# Altium footprint library ICs And Semiconductors THD.PcbLib: 292 footprints (part 16 of 19)
Each footprint in its own frame and in the unit in brackets; x right, y up, seen from the top. Pads: shape width x height; smd on the part's side, far side on the other; paste and mask are expansions set on the pad; w line width, h text height; cw(c..) or ccw(c..) is an arc to the next point about the centre after c.
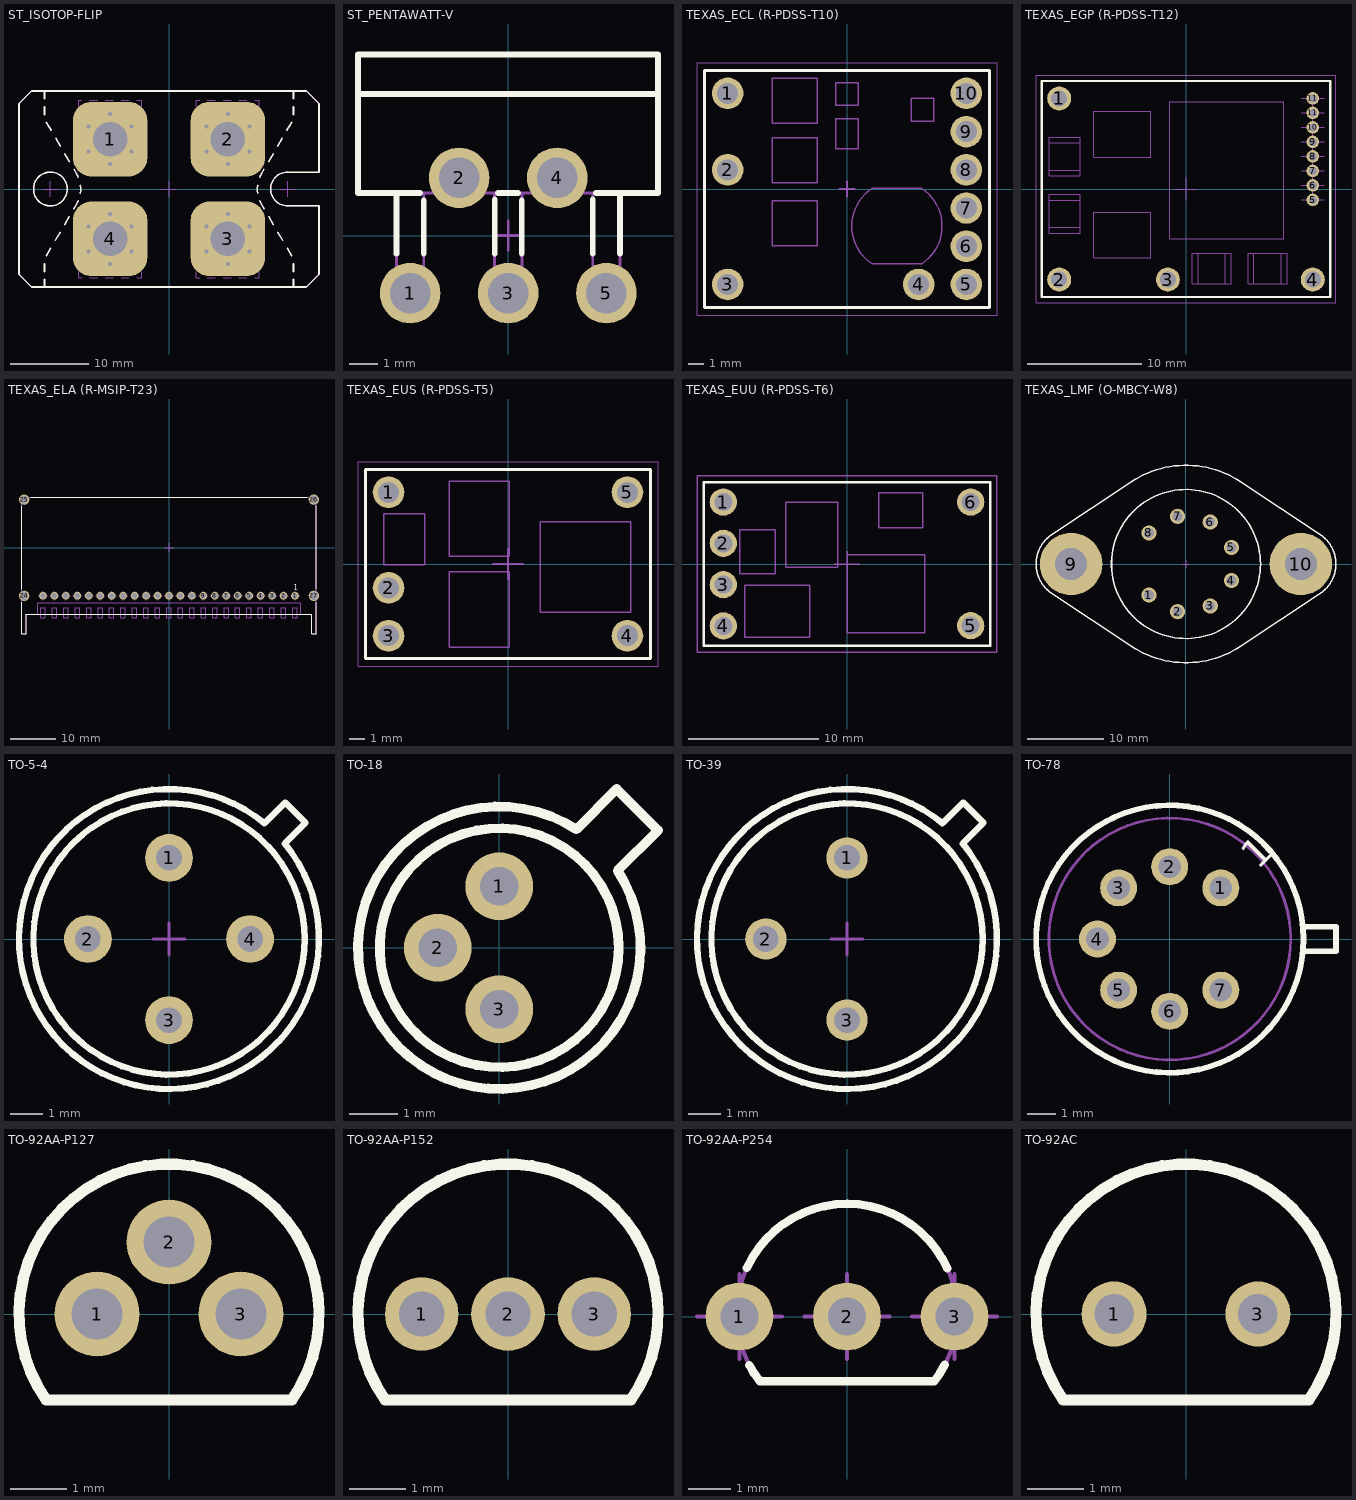
[diagram p15: the footprints below, top view; thin cyan lines are the x and y axes]

## ST_ISOTOP-FLIP [mm] "STMicroelectronics isotop Case, Body 38mm x 25.5mm, Screws on PCB Version"
height 12.2
pads (4):
  rrect50% 9.5x9.5 hole 4.4: 1(-7.5,6.35) 2(7.5,6.35) 3(7.5,-6.35) 4(-7.5,-6.35)
via -4.75,-4.763 diameter 1 hole 0.5
via -7.5,-3.175 diameter 1 hole 0.5
via -10.25,-4.763 diameter 1 hole 0.5
via -10.25,-7.938 diameter 1 hole 0.5
via -7.5,-9.525 diameter 1 hole 0.5
via -4.75,-7.938 diameter 1 hole 0.5
via 10.25,-4.763 diameter 1 hole 0.5
via 7.5,-3.175 diameter 1 hole 0.5
via 4.75,-4.763 diameter 1 hole 0.5
via 4.75,-7.938 diameter 1 hole 0.5
via 7.5,-9.525 diameter 1 hole 0.5
via 10.25,-7.938 diameter 1 hole 0.5
via -4.75,7.938 diameter 1 hole 0.5
via -7.5,9.525 diameter 1 hole 0.5
via -10.25,7.938 diameter 1 hole 0.5
via -10.25,4.763 diameter 1 hole 0.5
via -7.5,3.175 diameter 1 hole 0.5
via -4.75,4.763 diameter 1 hole 0.5
via 10.25,7.938 diameter 1 hole 0.5
via 7.5,9.525 diameter 1 hole 0.5
via 4.75,7.938 diameter 1 hole 0.5
via 4.75,4.763 diameter 1 hole 0.5
via 7.5,3.175 diameter 1 hole 0.5
via 10.25,4.763 diameter 1 hole 0.5
Top Overlay:
  circle w0.2: c-15.1,0 r2.15
  lines w0.2: -15.85,-11.521 -15.85,-12.479 ; -15.85,-10.521 -15.85,-9.521 ; -15.85,9.479 -15.85,10.479 ; -15.85,11.479 -15.85,12.479 ; -15.628,-8.521 -15.043,-7.521 ; -15.603,8.479 -15.018,7.479 ; -14.457,-6.521 -13.871,-5.521 ; -14.432,6.479 -13.847,5.479 ; -13.286,-4.521 -12.7,-3.521 ; -13.261,4.479 -12.676,3.479 ; -12.115,-2.521 -11.778,-1.945 ccw(c-15.1,0) -11.563,-1.521 ; -12.09,2.479 -11.778,1.945 cw(c-15.1,0) -11.545,1.479 ; -11.285,-0.521 ccw(c-15.1,0) -11.28,0.479 ; 11.28,0.479 ccw(c15.1,0) 11.285,-0.521 ; 11.545,1.479 cw(c15.1,0) 11.778,1.945 12.09,2.479 ; 11.563,-1.521 ccw(c15.1,0) 11.778,-1.945 12.115,-2.521 ; 12.676,3.479 13.261,4.479 ; 12.7,-3.521 13.286,-4.521 ; 13.847,5.479 14.432,6.479 ; 13.871,-5.521 14.457,-6.521 ; 15.018,7.479 15.603,8.479 ; 15.043,-7.521 15.628,-8.521 ; 15.85,-11.521 15.85,-12.479 ; 15.85,-10.521 15.85,-9.521 ; 15.85,9.479 15.85,10.479 ; 15.85,11.479 15.85,12.479 ; -15.85,-12.479 -17.5,-12.479 -19.1,-10.879 -19.1,10.879 -17.5,12.479 -15.85,12.479 ; -15.85,-12.479 15.85,-12.479 ; -15.85,12.479 15.85,12.479 ; 15.1,-2.15 cw(c15.1,0) 15.1,2.15 ; 15.1,-2.15 19.1,-2.15 ; 15.1,-2.15 19.1,-2.15 ; 15.1,2.15 19.1,2.15 ; 15.1,2.15 19.1,2.15 ; 15.85,-12.479 17.5,-12.479 19.1,-10.879 19.1,-2.15 ; 15.85,12.479 17.5,12.479 19.1,10.879 19.1,2.15
Notvisible:
  lines w0.1: -15.1,0 -16.1,0 -15.1,0 ; -15.1,0 -14.1,0 -15.1,0 ; -15.1,0 -15.1,1 -15.1,0 ; -15.1,0 -15.1,-1 -15.1,0 ; -7.5,-6.35 -8.5,-6.35 -7.5,-6.35 ; -7.5,-6.35 -6.5,-6.35 -7.5,-6.35 ; -7.5,-6.35 -7.5,-5.35 -7.5,-6.35 ; -7.5,-6.35 -7.5,-7.35 -7.5,-6.35 ; -7.5,6.35 -8.5,6.35 -7.5,6.35 ; -7.5,6.35 -6.5,6.35 -7.5,6.35 ; -7.5,6.35 -7.5,7.35 -7.5,6.35 ; -7.5,6.35 -7.5,5.35 -7.5,6.35 ; 0,0 -1,0 0,0 ; 0,0 1,0 0,0 ; 0,0 0,1 0,0 ; 0,0 0,-1 0,0 ; 7.5,-6.35 6.5,-6.35 7.5,-6.35 ; 7.5,-6.35 8.5,-6.35 7.5,-6.35 ; 7.5,-6.35 7.5,-5.35 7.5,-6.35 ; 7.5,-6.35 7.5,-7.35 7.5,-6.35 ; 7.5,6.35 6.5,6.35 7.5,6.35 ; 7.5,6.35 8.5,6.35 7.5,6.35 ; 7.5,6.35 7.5,7.35 7.5,6.35 ; 7.5,6.35 7.5,5.35 7.5,6.35 ; 15.1,0 14.1,0 15.1,0 ; 15.1,0 16.1,0 15.1,0 ; 15.1,0 15.1,1 15.1,0 ; 15.1,0 15.1,-1 15.1,0
Mechanical 14:
  circle w0.1: c-15.1,0 r2.15
  circle w0.1: c-7.5,-6.35 r2.2
  circle w0.1: c7.5,-6.35 r2.2
  circle w0.1: c7.5,6.35 r2.2
  circle w0.1: c-7.5,6.35 r2.2
  lines w0.1: -15.85,-11.521 -15.85,-12.479 ; -15.85,-10.521 -15.85,-9.521 ; -15.85,9.479 -15.85,10.479 ; -15.85,11.479 -15.85,12.479 ; -15.628,-8.521 -15.043,-7.521 ; -15.603,8.479 -15.018,7.479 ; -14.457,-6.521 -13.871,-5.521 ; -14.432,6.479 -13.847,5.479 ; -13.286,-4.521 -12.7,-3.521 ; -13.261,4.479 -12.676,3.479 ; -12.115,-2.521 -11.778,-1.945 ccw(c-15.1,0) -11.563,-1.521 ; -12.09,2.479 -11.778,1.945 cw(c-15.1,0) -11.545,1.479 ; -11.5,-10.521 -11.5,-11.314 -11.1,-11.314 ; -11.5,-9.521 -11.5,-8.521 ; -11.5,-7.521 -11.5,-6.521 ; -11.5,-5.521 -11.5,-4.521 ; -11.5,-3.521 -11.5,-3.342 ; -11.5,3.479 -11.5,3.342 -10.637,2.479 ; -11.5,4.479 -11.5,5.479 ; -11.5,6.479 -11.5,7.479 ; -11.5,8.479 -11.5,9.479 ; -11.5,10.479 -11.5,11.314 -11.1,11.314 ; -11.285,-0.521 ccw(c-15.1,0) -11.28,0.479 ; -10.1,-11.314 -9.1,-11.314 ; -10.1,11.314 -9.1,11.314 ; -10,1.842 -9.1,1.842 ; -8.1,-11.314 -7.1,-11.314 ; -8.1,1.842 -7.1,1.842 ; -8.1,11.314 -7.1,11.314 ; -6.1,-11.314 -5.1,-11.314 ; -6.1,1.842 -5.1,1.842 ; -6.1,11.314 -5.1,11.314 ; -5.1,-1.842 -6.1,-1.842 -5,-1.842 ; -4.363,2.479 -3.5,3.342 -3.5,3.479 ; -4.1,-11.314 -3.5,-11.314 -3.5,-10.521 ; -4.1,11.314 -3.5,11.314 -3.5,10.479 ; -3.5,-9.521 -3.5,-8.521 ; -3.5,-7.521 -3.5,-6.521 ; -3.5,-5.521 -3.5,-4.521 ; -3.5,-3.521 -3.5,-3.342 ; -3.5,4.479 -3.5,5.479 ; -3.5,6.479 -3.5,7.479 ; -3.5,8.479 -3.5,9.479 ; 3.5,-10.521 3.5,-11.314 3.9,-11.314 ; 3.5,-9.521 3.5,-8.521 ; 3.5,-7.521 3.5,-6.521 ; 3.5,-5.521 3.5,-4.521 ; 3.5,-3.521 3.5,-3.342 4.321,-2.521 ; 3.5,3.479 3.5,3.342 4.363,2.479 ; 3.5,4.479 3.5,5.479 ; 3.5,6.479 3.5,7.479 ; 3.5,8.479 3.5,9.479 ; 3.5,10.479 3.5,11.314 3.9,11.314 ; 4.9,-11.314 5.9,-11.314 ; 4.9,11.314 5.9,11.314 ; 5,-1.842 5.9,-1.842 ; 5,1.842 5.9,1.842 ; 6.9,-11.314 7.9,-11.314 ; 6.9,-1.842 7.9,-1.842 ; 6.9,1.842 7.9,1.842 ; 6.9,11.314 7.9,11.314 ; 8.9,-11.314 9.9,-11.314 ; 8.9,-1.842 9.9,-1.842 ; 8.9,1.842 9.9,1.842 ; 8.9,11.314 9.9,11.314 ; 10.637,2.479 11.5,3.342 11.5,3.479 ; 10.679,-2.521 11.5,-3.342 11.5,-3.521 ; 10.9,-11.314 11.5,-11.314 11.5,-10.521 ; 10.9,11.314 11.5,11.314 11.5,10.479 ; 11.28,0.479 ccw(c15.1,0) 11.285,-0.521 ; 11.5,-9.521 11.5,-8.521 ; 11.5,-7.521 11.5,-6.521 ; 11.5,-5.521 11.5,-4.521 ; 11.5,4.479 11.5,5.479 ; 11.5,6.479 11.5,7.479 ; 11.5,8.479 11.5,9.479 ; 11.545,1.479 cw(c15.1,0) 11.778,1.945 12.09,2.479 ; 11.563,-1.521 ccw(c15.1,0) 11.778,-1.945 12.115,-2.521 ; 12.676,3.479 13.261,4.479 ; 12.7,-3.521 13.286,-4.521 ; 13.847,5.479 14.432,6.479 ; 13.871,-5.521 14.457,-6.521 ; 15.018,7.479 15.603,8.479 ; 15.043,-7.521 15.628,-8.521 ; 15.85,-11.521 15.85,-12.479 ; 15.85,-10.521 15.85,-9.521 ; 15.85,9.479 15.85,10.479 ; 15.85,11.479 15.85,12.479 ; -15.85,-12.479 15.85,-12.479 ; -15.85,-12.479 -17.5,-12.479 -19.1,-10.879 -19.1,10.879 -17.5,12.479 -15.85,12.479 ; -15.85,12.479 15.85,12.479 ; -11.5,-3.342 -10.679,-2.521 -11.5,-3.342 ; -3.5,-3.342 -4.321,-2.521 -3.5,-3.342 ; 15.1,-2.15 cw(c15.1,0) 15.1,2.15 ; 15.1,-2.15 19.1,-2.15 ; 15.1,-2.15 19.1,-2.15 ; 15.1,2.15 19.1,2.15 ; 15.1,2.15 19.1,2.15 ; 15.85,-12.479 17.5,-12.479 19.1,-10.879 19.1,-2.15 ; 15.85,12.479 17.5,12.479 19.1,10.879 19.1,2.15 ; -10,-1.842 -9.1,-1.842 -10,-1.842 ; -8.1,-1.842 -7.1,-1.842 -8.1,-1.842
3D body "ST_ISOTOP-Flip_Part2.stp": height 10.24, standoff -4.69, extent -11.5,-10.365 11.5,10.365
3D body "ST_ISOTOP-Flip_Part1.stp": height 12.04, standoff 0, extent -19.1,-12.479 19.1,12.479

## ST_PENTAWATT-V [mm] "ONSEMICONDUCTOR 5 Leads PENTAWATT V Case"
height 3.68
pads (5):
  round 2.1 hole 1.4: 1(-3.4,-2) 2(-1.7,2) 3(0,-2) 4(1.7,2) 5(3.4,-2)
Top Overlay:
  lines w0.2: -5.208,4.905 5.192,4.905 ; -3.871,-0.631 -3.871,1.475 ; -3.06,1.475 -5.208,1.475 -5.208,6.275 5.192,6.275 5.192,1.475 3.043,1.475 ; -2.929,-0.626 -2.929,1.218 ; -0.471,-0.631 -0.471,1.244 ; -0.357,1.475 0.34,1.475 ; 0.471,-0.626 0.471,1.218 ; 2.929,-0.631 2.929,1.244 ; 3.871,-0.626 3.871,1.475
Notvisible:
  lines w0.1: -3.9,-2 -3.4,-2 ; -3.4,-2.5 -3.4,-2 ; -3.4,-1.5 -3.4,-2 ; -2.9,-2 -3.4,-2 ; -2.2,2 -1.7,2 ; -1.7,1.5 -1.7,2 ; -1.7,2.5 -1.7,2 ; -1.2,2 -1.7,2 ; -0.5,-2 0,-2 ; -0.5,0 0,0 ; 0,-2.5 0,-2 ; 0,-1.5 0,-2 ; 0,-0.5 0,0 ; 0,0.5 0,0 ; 0.5,-2 0,-2 ; 0.5,0 0,0 ; 1.2,2 1.7,2 ; 1.7,1.5 1.7,2 ; 1.7,2.5 1.7,2 ; 2.2,2 1.7,2 ; 2.9,-2 3.4,-2 ; 3.4,-2.5 3.4,-2 ; 3.4,-1.5 3.4,-2 ; 3.9,-2 3.4,-2
Mechanical 14:
  lines w0.1: -5.208,4.905 5.192,4.905 ; -3.871,1.475 -3.871,-2.225 -2.929,-2.225 -2.929,1.475 ; -0.471,1.475 -0.471,-2.225 0.471,-2.225 0.471,1.475 ; 2.929,1.475 2.929,-2.225 3.871,-2.225 3.871,1.475 ; -5.208,1.475 5.192,1.475 5.192,6.275 -5.208,6.275 -5.208,1.475
3D body "ST_PENTAWATT-V.stp": height 20.85, standoff -4.55, extent -5.208,-2.225 5.192,6.275

## TEXAS_ECL (R-PDSS-T10) [mm] "Texas ECL (R-PDSS-T10)  Case"
height 8.5
pads (10):
  round 2.1 hole 1.4: 1(-7.935,6.355) 2(-7.935,1.275) 3(-7.935,-6.345) 4(4.765,-6.345) 5(7.935,-6.345) 6(7.935,-3.805) 7(7.935,-1.265) 8(7.935,1.275) 9(7.935,3.815) 10(7.935,6.355)
Top Overlay:
  lines w0.2: -9.46,-7.875 9.46,-7.875 9.46,7.875 -9.46,7.875 -9.46,-7.875
Notvisible:
  lines w0.1: -8.435,-6.345 -7.935,-6.345 ; -8.435,1.275 -7.935,1.275 ; -8.435,6.355 -7.935,6.355 ; -7.935,-6.845 -7.935,-6.345 ; -7.935,-5.845 -7.935,-6.345 ; -7.935,0.775 -7.935,1.275 ; -7.935,1.775 -7.935,1.275 ; -7.935,5.855 -7.935,6.355 ; -7.935,6.855 -7.935,6.355 ; -7.435,-6.345 -7.935,-6.345 ; -7.435,1.275 -7.935,1.275 ; -7.435,6.355 -7.935,6.355 ; -0.5,0 0,0 ; 0,-0.5 0,0 ; 0,0.5 0,0 ; 0.5,0 0,0 ; 4.265,-6.345 4.765,-6.345 ; 4.765,-6.845 4.765,-6.345 ; 4.765,-5.845 4.765,-6.345 ; 5.265,-6.345 4.765,-6.345 ; 7.435,-6.345 7.935,-6.345 ; 7.435,-3.805 7.935,-3.805 ; 7.435,-1.265 7.935,-1.265 ; 7.435,1.275 7.935,1.275 ; 7.435,3.815 7.935,3.815 ; 7.435,6.355 7.935,6.355 ; 7.935,-6.845 7.935,-6.345 ; 7.935,-5.845 7.935,-6.345 ; 7.935,-4.305 7.935,-3.805 ; 7.935,-3.305 7.935,-3.805 ; 7.935,-1.765 7.935,-1.265 ; 7.935,-0.765 7.935,-1.265 ; 7.935,0.775 7.935,1.275 ; 7.935,1.775 7.935,1.275 ; 7.935,3.315 7.935,3.815 ; 7.935,4.315 7.935,3.815 ; 7.935,5.855 7.935,6.355 ; 7.935,6.855 7.935,6.355 ; 8.435,-6.345 7.935,-6.345 ; 8.435,-3.805 7.935,-3.805 ; 8.435,-1.265 7.935,-1.265 ; 8.435,1.275 7.935,1.275 ; 8.435,3.815 7.935,3.815 ; 8.435,6.355 7.935,6.355
Mechanical 14:
  lines w0.1: -9.46,-7.875 9.46,-7.875 9.46,7.875 -9.46,7.875 -9.46,-7.875 ; -4.963,-3.774 -4.963,-0.774 -1.963,-0.774 -1.963,-3.774 -4.963,-3.774 ; -4.963,0.422 -4.963,3.422 -1.963,3.422 -1.963,0.422 -4.963,0.422 ; -4.963,4.361 -4.963,7.361 -1.963,7.361 -1.963,4.361 -4.963,4.361 ; -0.75,2.683 -0.75,4.683 0.75,4.683 0.75,2.683 -0.75,2.683 ; -0.75,5.572 -0.75,7.072 0.75,7.072 0.75,5.572 -0.75,5.572 ; 1.656,-4.966 cw(c3.314,-2.466) 1.656,0.034 4.972,0.034 cw(c3.314,-2.466) 4.972,-4.966 1.656,-4.966 ; 4.255,4.516 4.255,6.016 5.755,6.016 5.755,4.516 4.255,4.516
Mechanical 15:
  lines w0.05: -9.97,-8.38 9.97,-8.38 9.97,8.38 -9.97,8.38 -9.97,-8.38
3D body "TEXAS_ECL (R-PDSS-T10).stp": height 8.5, standoff -3.55, extent -9.46,-7.875 9.46,7.875

## TEXAS_EGP (R-PDSS-T12) [mm] "Texas EGP (R-PDSS-T12) Case"
height 9.65
pads (12):
  round 2.1 hole 1.4: 1(-11.11,7.94) 2(-11.11,-7.94) 3(-1.59,-7.94) 4(11.11,-7.94)
  round 1.1 hole 0.7: 5(11.11,-0.95) 6(11.11,0.32) 7(11.11,1.59) 8(11.11,2.86) 9(11.11,4.13) 10(11.11,5.4) 11(11.11,6.67) 11(11.11,7.94)
Top Overlay:
  lines w0.2: -12.635,-9.46 -12.635,9.46 12.635,9.46 12.635,-9.46 -12.635,-9.46
Notvisible:
  lines w0.1: -12.11,-7.94 -11.11,-7.94 ; -12.11,7.94 -11.11,7.94 ; -11.11,-8.94 -11.11,-7.94 ; -11.11,-6.94 -11.11,-7.94 ; -11.11,6.94 -11.11,7.94 ; -11.11,8.94 -11.11,7.94 ; -10.11,-7.94 -11.11,-7.94 ; -10.11,7.94 -11.11,7.94 ; -2.59,-7.94 -1.59,-7.94 ; -1.59,-8.94 -1.59,-7.94 ; -1.59,-6.94 -1.59,-7.94 ; -1,0 0,0 ; -0.59,-7.94 -1.59,-7.94 ; 0,-1 0,0 ; 0,1 0,0 ; 1,0 0,0 ; 10.11,-7.94 11.11,-7.94 ; 10.11,-0.95 11.11,-0.95 ; 10.11,0.32 11.11,0.32 12.11,0.32 ; 10.11,1.59 11.11,1.59 12.11,1.59 ; 10.11,2.86 11.11,2.86 12.11,2.86 ; 10.11,4.13 11.11,4.13 12.11,4.13 ; 10.11,5.4 11.11,5.4 12.11,5.4 ; 10.11,6.67 11.11,6.67 12.11,6.67 ; 10.11,7.94 11.11,7.94 ; 11.11,-8.94 11.11,-7.94 ; 11.11,-6.94 11.11,-7.94 ; 12.11,-7.94 11.11,-7.94 ; 12.11,-0.95 11.11,-0.95 ; 12.11,7.94 11.11,7.94 ; 11.11,-0.95 11.11,7.94
Mechanical 14:
  lines w0.1: -11.987,-3.37 -9.287,-3.37 ; -11.987,-0.97 -9.287,-0.97 ; -11.987,1.648 -9.287,1.648 ; -11.987,4.048 -9.287,4.048 ; 1.053,-8.309 1.053,-5.609 ; 3.453,-8.309 3.453,-5.609 ; 5.957,-8.309 5.957,-5.609 ; 8.357,-8.309 8.357,-5.609 ; -12.635,-9.46 -12.635,9.46 12.635,9.46 12.635,-9.46 -12.635,-9.46 ; -11.987,-3.87 -11.987,-0.47 -9.287,-0.47 -9.287,-3.87 -11.987,-3.87 ; -11.987,1.148 -11.987,4.548 -9.287,4.548 -9.287,1.148 -11.987,1.148 ; -8.076,-6.046 -8.076,-2.046 -3.076,-2.046 -3.076,-6.046 -8.076,-6.046 ; -8.076,2.804 -8.076,6.804 -3.076,6.804 -3.076,2.804 -8.076,2.804 ; -1.431,-4.339 8.569,-4.339 8.569,7.661 -1.431,7.661 -1.431,-4.339 ; 0.553,-8.309 0.553,-5.609 3.953,-5.609 3.953,-8.309 0.553,-8.309 ; 5.457,-8.309 5.457,-5.609 8.857,-5.609 8.857,-8.309 5.457,-8.309
Mechanical 15:
  lines w0.1: -13.145,-9.97 13.145,-9.97 13.145,9.97 -13.145,9.97 -13.145,-9.97
3D body "TEXAS_EGP (R-PDSS-T12).stp": height 9.65, standoff -3.55, extent -12.635,-9.46 12.635,9.46

## TEXAS_ELA (R-MSIP-T23) [mm] "TEXAS (R-MSIP-T23) Case"
height 12.7
pads (27):
  round 1.7 hole 1.2: 1(27.94,-10.665) 2(25.4,-10.665) 3(22.86,-10.665) 4(20.32,-10.665) 5(17.78,-10.665) 6(15.24,-10.665) 7(12.7,-10.665) 8(10.16,-10.665) 9(7.62,-10.665) 10(5.08,-10.665) 11(2.54,-10.665) 12(0,-10.665) 13(-2.54,-10.665) 14(-5.08,-10.665) 15(-7.62,-10.665) 16(-10.16,-10.665) 17(-12.7,-10.665) 18(-15.24,-10.665) 19(-17.78,-10.665) 20(-20.32,-10.665) 21(-22.86,-10.665) 22(-25.4,-10.665) 23(-27.94,-10.665)
  round 2.3 hole 1.8: 24(-32.105,-10.665) 25(-32.105,10.665) 26(32.105,10.665) 27(32.105,-10.665)
Top Overlay:
  lines w0.2: -32.605,-12.079 -32.605,-19.055 -31.605,-19.055 -31.605,-14.735 31.605,-14.735 31.605,-19.055 32.605,-19.055 32.605,-12.079 ; -32.605,-9.251 -32.605,9.251 ; -30.691,11.165 30.691,11.165 ; 32.605,-9.251 32.605,9.251
  text "1" at 27.559,-9.398 h1.27
Notvisible:
  lines w0.1: -33.105,-10.665 -32.105,-10.665 ; -33.105,10.665 -32.105,10.665 ; -32.105,-11.665 -32.105,-10.665 ; -32.105,-9.665 -32.105,-10.665 ; -32.105,9.665 -32.105,10.665 ; -32.105,11.665 -32.105,10.665 ; -31.105,-10.665 -32.105,-10.665 ; -31.105,10.665 -32.105,10.665 ; -28.94,-10.665 -27.94,-10.665 ; -27.94,-11.665 -27.94,-10.665 ; -27.94,-9.665 -27.94,-10.665 ; -26.94,-10.665 -27.94,-10.665 ; -26.4,-10.665 -25.4,-10.665 ; -25.4,-11.665 -25.4,-10.665 ; -25.4,-9.665 -25.4,-10.665 ; -24.4,-10.665 -25.4,-10.665 ; -23.86,-10.665 -22.86,-10.665 ; -22.86,-11.665 -22.86,-10.665 ; -22.86,-9.665 -22.86,-10.665 ; -21.86,-10.665 -22.86,-10.665 ; -21.32,-10.665 -20.32,-10.665 ; -20.32,-11.665 -20.32,-10.665 ; -20.32,-9.665 -20.32,-10.665 ; -19.32,-10.665 -20.32,-10.665 ; -18.78,-10.665 -17.78,-10.665 ; -17.78,-11.665 -17.78,-10.665 ; -17.78,-9.665 -17.78,-10.665 ; -16.78,-10.665 -17.78,-10.665 ; -16.24,-10.665 -15.24,-10.665 ; -15.24,-11.665 -15.24,-10.665 ; -15.24,-9.665 -15.24,-10.665 ; -14.24,-10.665 -15.24,-10.665 ; -13.7,-10.665 -12.7,-10.665 ; -12.7,-11.665 -12.7,-10.665 ; -12.7,-9.665 -12.7,-10.665 ; -11.7,-10.665 -12.7,-10.665 ; -11.16,-10.665 -10.16,-10.665 ; -10.16,-11.665 -10.16,-10.665 ; -10.16,-9.665 -10.16,-10.665 ; -9.16,-10.665 -10.16,-10.665 ; -8.62,-10.665 -7.62,-10.665 ; -7.62,-11.665 -7.62,-10.665 ; -7.62,-9.665 -7.62,-10.665 ; -6.62,-10.665 -7.62,-10.665 ; -6.08,-10.665 -5.08,-10.665 ; -5.08,-11.665 -5.08,-10.665 ; -5.08,-9.665 -5.08,-10.665 ; -4.08,-10.665 -5.08,-10.665 ; -3.54,-10.665 -2.54,-10.665 ; -2.54,-11.665 -2.54,-10.665 ; -2.54,-9.665 -2.54,-10.665 ; -1.54,-10.665 -2.54,-10.665 ; -1,-10.665 0,-10.665 ; -1,0 0,0 ; 0,-11.665 0,-10.665 ; 0,-9.665 0,-10.665 ; 0,-1 0,0 ; 0,1 0,0 ; 1,-10.665 0,-10.665 ; 1,0 0,0 ; 1.54,-10.665 2.54,-10.665 ; 2.54,-11.665 2.54,-10.665 ; 2.54,-9.665 2.54,-10.665 ; 3.54,-10.665 2.54,-10.665 ; 4.08,-10.665 5.08,-10.665 ; 5.08,-11.665 5.08,-10.665 ; 5.08,-9.665 5.08,-10.665 ; 6.08,-10.665 5.08,-10.665 ; 6.62,-10.665 7.62,-10.665 ; 7.62,-11.665 7.62,-10.665 ; 7.62,-9.665 7.62,-10.665 ; 8.62,-10.665 7.62,-10.665 ; 9.16,-10.665 10.16,-10.665 ; 10.16,-11.665 10.16,-10.665 ; 10.16,-9.665 10.16,-10.665 ; 11.16,-10.665 10.16,-10.665 ; 11.7,-10.665 12.7,-10.665 ; 12.7,-11.665 12.7,-10.665 ; 12.7,-9.665 12.7,-10.665 ; 13.7,-10.665 12.7,-10.665 ; 14.24,-10.665 15.24,-10.665 ; 15.24,-11.665 15.24,-10.665 ; 15.24,-9.665 15.24,-10.665 ; 16.24,-10.665 15.24,-10.665 ; 16.78,-10.665 17.78,-10.665 ; 17.78,-11.665 17.78,-10.665 ; 17.78,-9.665 17.78,-10.665 ; 18.78,-10.665 17.78,-10.665 ; 19.32,-10.665 20.32,-10.665 ; 20.32,-11.665 20.32,-10.665 ; 20.32,-9.665 20.32,-10.665 ; 21.32,-10.665 20.32,-10.665 ; 21.86,-10.665 22.86,-10.665 ; 22.86,-11.665 22.86,-10.665 ; 22.86,-9.665 22.86,-10.665 ; 23.86,-10.665 22.86,-10.665 ; 24.4,-10.665 25.4,-10.665 ; 25.4,-11.665 25.4,-10.665 ; 25.4,-9.665 25.4,-10.665 ; 26.4,-10.665 25.4,-10.665 ; 26.94,-10.665 27.94,-10.665 ; 27.94,-11.665 27.94,-10.665 ; 27.94,-9.665 27.94,-10.665 ; 28.94,-10.665 27.94,-10.665 ; 31.105,-10.665 32.105,-10.665 ; 31.105,10.665 32.105,10.665 ; 32.105,-11.665 32.105,-10.665 ; 32.105,-9.665 32.105,-10.665 ; 32.105,9.665 32.105,10.665 ; 32.105,11.665 32.105,10.665 ; 33.105,-10.665 32.105,-10.665 ; 33.105,10.665 32.105,10.665
Mechanical 14:
  lines w0.1: -29.105,-14.735 -29.105,-12.235 29.105,-12.235 29.105,-14.735 ; -28.44,-14.735 -31.605,-14.735 -31.605,-19.055 -32.605,-19.055 -32.605,11.165 32.605,11.165 32.605,-19.055 31.605,-19.055 31.605,-14.735 28.44,-14.735 ; -27.44,-14.735 -25.9,-14.735 ; -24.9,-14.735 -23.36,-14.735 ; -22.36,-14.735 -20.82,-14.735 ; -19.82,-14.735 -18.28,-14.735 ; -17.28,-14.735 -15.74,-14.735 ; -14.74,-14.735 -13.2,-14.735 ; -12.2,-14.735 -10.66,-14.735 ; -9.66,-14.735 -8.12,-14.735 ; -7.12,-14.735 -5.58,-14.735 ; -4.58,-14.735 -3.04,-14.735 ; -2.04,-14.735 -0.5,-14.735 ; 0.5,-14.735 2.04,-14.735 ; 3.04,-14.735 4.58,-14.735 ; 5.58,-14.735 7.12,-14.735 ; 8.12,-14.735 9.66,-14.735 ; 10.66,-14.735 12.2,-14.735 ; 13.2,-14.735 14.74,-14.735 ; 15.74,-14.735 17.28,-14.735 ; 18.28,-14.735 19.82,-14.735 ; 20.82,-14.735 22.36,-14.735 ; 23.36,-14.735 24.9,-14.735 ; 25.9,-14.735 27.44,-14.735 ; -28.44,-15.535 -28.44,-13.331 -27.44,-13.331 -27.44,-15.535 -28.44,-15.535 ; -25.9,-15.535 -25.9,-13.331 -24.9,-13.331 -24.9,-15.535 -25.9,-15.535 ; -23.36,-15.535 -23.36,-13.331 -22.36,-13.331 -22.36,-15.535 -23.36,-15.535 ; -20.82,-15.535 -20.82,-13.331 -19.82,-13.331 -19.82,-15.535 -20.82,-15.535 ; -18.28,-15.535 -18.28,-13.331 -17.28,-13.331 -17.28,-15.535 -18.28,-15.535 ; -15.74,-15.535 -15.74,-13.331 -14.74,-13.331 -14.74,-15.535 -15.74,-15.535 ; -13.2,-15.535 -13.2,-13.331 -12.2,-13.331 -12.2,-15.535 -13.2,-15.535 ; -10.66,-15.535 -10.66,-13.331 -9.66,-13.331 -9.66,-15.535 -10.66,-15.535 ; -8.12,-15.535 -8.12,-13.331 -7.12,-13.331 -7.12,-15.535 -8.12,-15.535 ; -5.58,-15.535 -5.58,-13.331 -4.58,-13.331 -4.58,-15.535 -5.58,-15.535 ; -3.04,-15.535 -3.04,-13.331 -2.04,-13.331 -2.04,-15.535 -3.04,-15.535 ; -0.5,-15.535 -0.5,-13.331 0.5,-13.331 0.5,-15.535 -0.5,-15.535 ; 2.04,-15.535 2.04,-13.331 3.04,-13.331 3.04,-15.535 2.04,-15.535 ; 4.58,-15.535 4.58,-13.331 5.58,-13.331 5.58,-15.535 4.58,-15.535 ; 7.12,-15.535 7.12,-13.331 8.12,-13.331 8.12,-15.535 7.12,-15.535 ; 9.66,-15.535 9.66,-13.331 10.66,-13.331 10.66,-15.535 9.66,-15.535 ; 12.2,-15.535 12.2,-13.331 13.2,-13.331 13.2,-15.535 12.2,-15.535 ; 14.74,-15.535 14.74,-13.331 15.74,-13.331 15.74,-15.535 14.74,-15.535 ; 17.28,-15.535 17.28,-13.331 18.28,-13.331 18.28,-15.535 17.28,-15.535 ; 19.82,-15.535 19.82,-13.331 20.82,-13.331 20.82,-15.535 19.82,-15.535 ; 22.36,-15.535 22.36,-13.331 23.36,-13.331 23.36,-15.535 22.36,-15.535 ; 24.9,-15.535 24.9,-13.331 25.9,-13.331 25.9,-15.535 24.9,-15.535 ; 27.44,-15.535 27.44,-13.331 28.44,-13.331 28.44,-15.535 27.44,-15.535
  text "1" at 27.559,-9.398 h1.27
3D body "TEXAS_ELA (R-MSIP-T23).stp": height 12.7, standoff -4, extent -32.605,-19.055 32.605,11.165

## TEXAS_EUS (R-PDSS-T5) [mm] "Texas EUS (R-PDSS-T5) Case"
height 8.5
pads (5):
  round 2.1 hole 1.4: 1(-7.94,4.765) 2(-7.94,-1.585) 3(-7.94,-4.765) 4(7.94,-4.765) 5(7.94,4.765)
Top Overlay:
  lines w0.2: -9.46,-6.285 9.46,-6.285 9.46,6.285 -9.46,6.285 -9.46,-6.285
Notvisible:
  lines w0.1: -8.94,-4.765 -7.94,-4.765 ; -8.94,-1.585 -7.94,-1.585 ; -8.94,4.765 -7.94,4.765 ; -7.94,-5.765 -7.94,-4.765 ; -7.94,-3.765 -7.94,-4.765 ; -7.94,-2.585 -7.94,-1.585 ; -7.94,-0.585 -7.94,-1.585 ; -7.94,3.765 -7.94,4.765 ; -7.94,5.765 -7.94,4.765 ; -6.94,-4.765 -7.94,-4.765 ; -6.94,-1.585 -7.94,-1.585 ; -6.94,4.765 -7.94,4.765 ; -1,0 0,0 ; 0,-1 0,0 ; 0,1 0,0 ; 1,0 0,0 ; 6.94,-4.765 7.94,-4.765 ; 6.94,4.765 7.94,4.765 ; 7.94,-5.765 7.94,-4.765 ; 7.94,-3.765 7.94,-4.765 ; 7.94,3.765 7.94,4.765 ; 7.94,5.765 7.94,4.765 ; 8.94,-4.765 7.94,-4.765 ; 8.94,4.765 7.94,4.765
Mechanical 14:
  lines w0.1: -9.46,-6.285 -9.46,6.285 9.46,6.285 9.46,-6.285 -9.46,-6.285 ; -8.247,-0.059 -8.247,3.341 -5.547,3.341 -5.547,-0.059 -8.247,-0.059 ; -3.912,-5.523 -3.912,-0.523 0.088,-0.523 0.088,-5.523 -3.912,-5.523 ; -3.912,0.502 -3.912,5.502 0.088,5.502 0.088,0.502 -3.912,0.502 ; 2.154,-3.194 2.154,2.806 8.154,2.806 8.154,-3.194 2.154,-3.194
Mechanical 15:
  lines w0.05: -9.97,-6.795 -9.97,6.795 9.97,6.795 9.97,-6.795 -9.97,-6.795
3D body "TEXAS_EUS (R-PDSS-T5).stp": height 8.5, standoff -3.55, extent -9.46,-6.285 9.46,6.285

## TEXAS_EUU (R-PDSS-T6) [mm] "Texas TEXAS_EUU (R-PDSS-T6) Case"
height 8.5
pads (6):
  round 2.1 hole 1.4: 1(-9.53,4.77) 2(-9.53,1.59) 3(-9.53,-1.59) 4(-9.53,-4.77) 5(9.53,-4.75) 6(9.53,4.77)
Top Overlay:
  lines w0.2: -11.05,-6.285 -11.05,6.285 11.05,6.285 11.05,-6.285 -11.05,-6.285
Notvisible:
  lines w0.1: -10.53,-4.77 -9.53,-4.77 ; -10.53,-1.59 -9.53,-1.59 ; -10.53,1.59 -9.53,1.59 ; -10.53,4.77 -9.53,4.77 ; -9.53,-5.77 -9.53,-4.77 ; -9.53,-3.77 -9.53,-4.77 ; -9.53,-2.59 -9.53,-1.59 ; -9.53,-0.59 -9.53,-1.59 ; -9.53,0.59 -9.53,1.59 ; -9.53,2.59 -9.53,1.59 ; -9.53,3.77 -9.53,4.77 ; -9.53,5.77 -9.53,4.77 ; -8.53,-4.77 -9.53,-4.77 ; -8.53,-1.59 -9.53,-1.59 ; -8.53,1.59 -9.53,1.59 ; -8.53,4.77 -9.53,4.77 ; -1,0 0,0 ; 0,-1 0,0 ; 0,1 0,0 ; 1,0 0,0 ; 8.53,-4.75 9.53,-4.75 ; 8.53,4.77 9.53,4.77 ; 9.53,-5.75 9.53,-4.75 ; 9.53,-3.75 9.53,-4.75 ; 9.53,3.77 9.53,4.77 ; 9.53,5.77 9.53,4.77 ; 10.53,-4.75 9.53,-4.75 ; 10.53,4.77 9.53,4.77
Mechanical 14:
  lines w0.1: -11.05,-6.285 -11.05,6.285 11.05,6.285 11.05,-6.285 -11.05,-6.285 ; -8.247,-0.77 -5.547,-0.77 -5.547,2.63 -8.247,2.63 -8.247,-0.77 ; -7.867,-5.631 -2.867,-5.631 -2.867,-1.631 -7.867,-1.631 -7.867,-5.631 ; -4.715,-0.254 -0.715,-0.254 -0.715,4.746 -4.715,4.746 -4.715,-0.254 ; 0,-5.285 6,-5.285 6,0.715 0,0.715 0,-5.285 ; 2.45,2.799 2.45,5.499 5.85,5.499 5.85,2.799 2.45,2.799
Mechanical 15:
  lines w0.1: -11.56,-6.795 -11.56,6.795 11.56,6.795 11.56,-6.795 -11.56,-6.795
3D body "TEXAS_EUU (R-PDSS-T6).stp": height 8.5, standoff -3.55, extent -11.05,-6.285 11.05,6.285

## TEXAS_LMF (O-MBCY-W8) [mm] "TO-3 8 Pins, Texas LMF (O-MBCY-W8) Case"
height 7.62
pads (10):
  round 2 hole 1.3: 1(-4.864,-4.082) 2(-1.103,-6.254) 3(3.175,-5.499) 4(5.967,-2.172) 5(5.967,2.172) 6(3.175,5.499) 7(-1.103,6.254) 8(-4.864,4.082)
  round 8.2 hole 4.2: 9(-15.075,0) 10(15.075,0)
Top Overlay:
  circle w0.2: c0,0 r9.78
  lines w0.2: -17.627,-3.839 cw(c-15.075,0) -17.627,3.839 -7.171,10.789 cw(c0,0) 7.171,10.789 17.627,3.839 cw(c15.075,0) 17.627,-3.839 7.171,-10.789 cw(c0,0) -7.171,-10.789 -17.627,-3.839
Notvisible:
  lines w0.1: -15.575,0 -15.075,0 ; -15.075,-0.5 -15.075,0 ; -15.075,0.5 -15.075,0 ; -14.575,0 -15.075,0 ; -5.247,-4.403 -4.864,-4.082 ; -5.247,4.403 -4.864,4.082 ; -5.186,-3.699 -4.864,-4.082 ; -5.186,3.699 -4.864,4.082 ; -4.543,-4.465 -4.864,-4.082 ; -4.543,4.465 -4.864,4.082 ; -4.481,-3.76 -4.864,-4.082 ; -4.481,3.76 -4.864,4.082 ; -1.595,-6.167 -1.103,-6.254 ; -1.595,6.167 -1.103,6.254 ; -1.189,-6.746 -1.103,-6.254 ; -1.189,6.746 -1.103,6.254 ; -1.016,-5.761 -1.103,-6.254 ; -1.016,5.761 -1.103,6.254 ; -0.61,-6.34 -1.103,-6.254 ; -0.61,6.34 -1.103,6.254 ; -0.5,0 0,0 ; 0,-0.5 0,0 ; 0,0.5 0,0 ; 0.5,0 0,0 ; 2.742,-5.749 3.175,-5.499 ; 2.742,5.749 3.175,5.499 ; 2.925,-5.066 3.175,-5.499 ; 2.925,5.066 3.175,5.499 ; 3.425,-5.932 3.175,-5.499 ; 3.425,5.932 3.175,5.499 ; 3.608,-5.249 3.175,-5.499 ; 3.608,5.249 3.175,5.499 ; 5.497,-2.001 5.967,-2.172 ; 5.497,2.001 5.967,2.172 ; 5.796,-2.642 5.967,-2.172 ; 5.796,2.642 5.967,2.172 ; 6.138,-1.702 5.967,-2.172 ; 6.138,1.702 5.967,2.172 ; 6.437,-2.343 5.967,-2.172 ; 6.437,2.343 5.967,2.172 ; 14.575,0 15.075,0 ; 15.075,-0.5 15.075,0 ; 15.075,0.5 15.075,0 ; 15.575,0 15.075,0
Mechanical 14:
  circle w0.1: c-15.075,0 r1.95
  circle w0.1: c15.075,0 r1.95
  circle w0.1: c0,0 r9.78
  lines w0.1: -17.627,-3.839 cw(c-15.075,0) -17.627,3.839 -7.171,10.789 cw(c0,0) 7.171,10.789 17.627,3.839 cw(c15.075,0) 17.627,-3.839 7.171,-10.789 cw(c0,0) -7.171,-10.789 -17.627,-3.839
3D body "TEXAS_LMF (O–MBCY–W8).stp": height 7.62, standoff -6, extent -19.639,-12.955 19.64,12.955

## TO-5-4 [mm] "TO-5, 4 Leads"
height 11.25
pads (4):
  round 1.5 hole 0.8: 1(0,2.54) 2(-2.54,0) 3(0,-2.54) 4(2.54,0)
Top Overlay:
  circle w0.2: c0,0 r4.25
  lines w0.2: 2.99,3.626 ccw(c0,0) 3.626,2.99 4.278,3.642 3.642,4.278 2.99,3.626
Notvisible:
  lines w0.1: -3.04,0 -2.54,0 ; -2.54,-0.5 -2.54,0 ; -2.54,0.5 -2.54,0 ; -2.04,0 -2.54,0 ; -0.5,-2.54 0,-2.54 ; -0.5,0 0,0 ; -0.5,2.54 0,2.54 ; 0,-3.04 0,-2.54 ; 0,-2.04 0,-2.54 ; 0,-0.5 0,0 ; 0,0.5 0,0 ; 0,2.04 0,2.54 ; 0,3.04 0,2.54 ; 0.5,-2.54 0,-2.54 ; 0.5,0 0,0 ; 0.5,2.54 0,2.54
Mechanical 14:
  circle w0.1: c0,0 r4.25
  lines w0.1: 2.99,3.626 ccw(c0,0) 3.626,2.99 4.278,3.642 3.642,4.278 2.99,3.626
3D body "TO-5-3.stp": height 11.25, standoff -3.65, extent -4.7,-4.7 4.7,4.7

## TO-18 [mm] "TO-18  3 Leads, Pitch 2.54mm, Body Dia. 5.84mm, Leads Dia. 0.5mm"
height 10.13
pads (3):
  round 1.4 hole 0.8: 1(0,1.27) 2(-1.27,0) 3(0,-1.27)
Top Overlay:
  circle w0.2: c0,0 r2.47
  lines w0.2: 1.593,2.447 ccw(c0,0) 2.447,1.593 3.282,2.428 2.428,3.282 1.593,2.447
Mechanical 14:
  circle w0.1: c0,0 r2.47
  lines w0.1: 1.593,2.447 ccw(c0,0) 2.447,1.593 3.282,2.428 2.428,3.282 1.593,2.447
3D body "TO-18.stp": height 10.13, standoff -3.6, extent -2.92,-2.92 3.282,3.282

## TO-39 [mm] "TO-39  3 Leads, Pitch 2.54mm, Body Dia. 9.4mm, Leads Dia. 0.5mm"
height 6.6
pads (3):
  round 1.3 hole 0.8: 1(0,2.54) 2(-2.54,0) 3(0,-2.54)
Top Overlay:
  circle w0.2: c0,0 r4.25
  lines w0.2: 2.99,3.626 ccw(c0,0) 3.626,2.99 4.278,3.642 3.642,4.278 2.99,3.626
Notvisible:
  lines w0.1: -3.04,0 -2.54,0 ; -2.54,-0.5 -2.54,0 ; -2.54,0.5 -2.54,0 ; -2.04,0 -2.54,0 ; -0.5,-2.54 0,-2.54 ; -0.5,0 0,0 ; -0.5,2.54 0,2.54 ; 0,-3.04 0,-2.54 ; 0,-2.04 0,-2.54 ; 0,-0.5 0,0 ; 0,0.5 0,0 ; 0,2.04 0,2.54 ; 0,3.04 0,2.54 ; 0.5,-2.54 0,-2.54 ; 0.5,0 0,0 ; 0.5,2.54 0,2.54
Mechanical 14:
  circle w0.1: c0,0 r4.25
  lines w0.1: 2.99,3.626 ccw(c0,0) 3.626,2.99 4.278,3.642 3.642,4.278 2.99,3.626
3D body "TO-39.stp": height 11.25, standoff -3.65, extent -4.7,-4.7 4.7,4.7

## TO-78 [mm] "TO-78 7 Leads, Body Dia. 9.4mm (max), Lead Diameter 5.08mm"
height 4.7
pads (7):
  round 1.3 hole 0.8: 1(1.796,1.796) 2(0,2.54) 3(-1.796,1.796) 4(-2.54,0) 5(-1.796,-1.796) 6(0,-2.54) 7(1.796,-1.796)
Top Overlay:
  circle w0.2: c0,0 r4.699
  lines w0.2: 4.679,-0.432 5.842,-0.432 5.842,0.432 4.679,0.432
  text "1" at 3.098,2.391 h1
Notvisible:
  text "2" at 0.5,3.667 h1
  text "3" at -2.239,2.946 h1
  text "4" at -3.643,0.5 h1
  text "5" at -2.946,-2.239 h1
  text "6" at -0.5,-3.69 h1
  text "7" at 2.239,-2.946 h1
Mechanical 14:
  circle w0.1: c0,0 r4.25
  circle w0.1: c0,0 r4.699
  lines w0.1: 4.679,-0.432 5.842,-0.432 5.842,0.432 4.679,0.432
  text "1" at 3.098,2.391 h1
3D body "TO-78.stp": height 4.7, standoff -3.6, extent -4.695,-4.695 5.835,4.695

## TO-92AA-P127 [mm] "TO-92 (TO-226),  Pitch 1.27mm, Flat Index, 3 In-Line, Axial Leads, Body Dia. 5.3mm, Leads Dia. 0.5mm (max)"
height 5.33
pads (3):
  round 1.5 hole 0.9: 1(-1.27,0) 2(0,1.27) 3(1.27,0)
Top Overlay:
  lines w0.2: -2.171,-1.52 cw(c0,0) 2.171,-1.52 -2.171,-1.52
Mechanical 14:
  lines w0.1: -2.171,-1.52 cw(c0,0) 2.171,-1.52 -2.171,-1.52
3D body "TO-92AA-P127.stp": height 9.33, standoff -3.2, extent -2.579,-1.53 2.579,2.638

## TO-92AA-P152 [mm] "TO-92 (TO-226),  Pitch 1.524mm, Flat Index, 3 In-Line, Axial Leads, Body Dia. 5.3mm, Leads Dia. 0.5mm (max)"
height 5.33
pads (3):
  round 1.3 hole 0.8: 1(-1.524,0) 2(0,0) 3(1.524,0)
Top Overlay:
  lines w0.2: -2.171,-1.52 cw(c0,0) 2.171,-1.52 -2.171,-1.52
Mechanical 14:
  lines w0.1: -2.171,-1.52 cw(c0,0) 2.171,-1.52 -2.171,-1.52
3D body "TO-92AA-P152.stp": height 9.33, standoff -3.2, extent -2.587,-1.53 2.588,2.66

## TO-92AA-P254 [mm] "TO-92 (TO226), Pitch 2.54mm, Flat Index, 3 In-Line, Bent Leads, Body Dia. 5.3mm"
height 9.33
pads (3):
  round 1.6 hole 0.9: 1(-2.54,0) 2(0,0) 3(2.54,0)
Top Overlay:
  lines w0.2: -2.363,1.145 cw(c0,0.059) 2.369,1.133 ; -2.302,-1.151 ccw(c0,0.059) -2.059,-1.53 2.059,-1.53 ccw(c0,0.059) 2.307,-1.141
Notvisible:
  lines w0.1: -3.54,0 -2.54,0 ; -2.54,-1 -2.54,0 ; -2.54,1 -2.54,0 ; -1.54,0 -2.54,0 ; -1,0 0,0 ; 0,-1 0,0 ; 0,1 0,0 ; 1,0 0,0 ; 1.54,0 2.54,0 ; 2.54,-1 2.54,0 ; 2.54,1 2.54,0 ; 3.54,0 2.54,0
Mechanical 14:
  lines w0.1: -2.059,-1.53 cw(c0,0.059) 2.059,-1.53 -2.059,-1.53
3D body "TO-92AA-P254.stp": height 9.33, standoff -3.2, extent -2.81,-1.53 2.81,2.638

## TO-92AC [mm] "TO-92 (TO-226), Flat Index, 2 In-Line, Pitch 2.54mm, Axial Leads, Body Dia. 5.3mm, Leads Dia. 0.5mm (max)"
height 5.33
pads (2):
  round 1.15 hole 0.7: 1(-1.27,0) 3(1.27,0)
Top Overlay:
  lines w0.2: -2.171,-1.52 cw(c0,0) 2.171,-1.52 -2.171,-1.52
Mechanical 14:
  lines w0.1: -2.171,-1.52 cw(c0,0) 2.171,-1.52 -2.171,-1.52
3D body "TO-92AC.stp": height 9.33, standoff -3.2, extent -2.659,-1.523 2.516,2.667